# Altium footprint library ICs And Semiconductors THD.PcbLib: 507 footprints (part 11 of 32)
Each footprint in its own frame and in the unit in brackets; x right, y up, seen from the top. Pads: shape width x height; smd on the part's side, far side on the other; paste and mask are expansions set on the pad; w line width, h text height; cw(c..) or ccw(c..) is an arc to the next point about the centre after c.
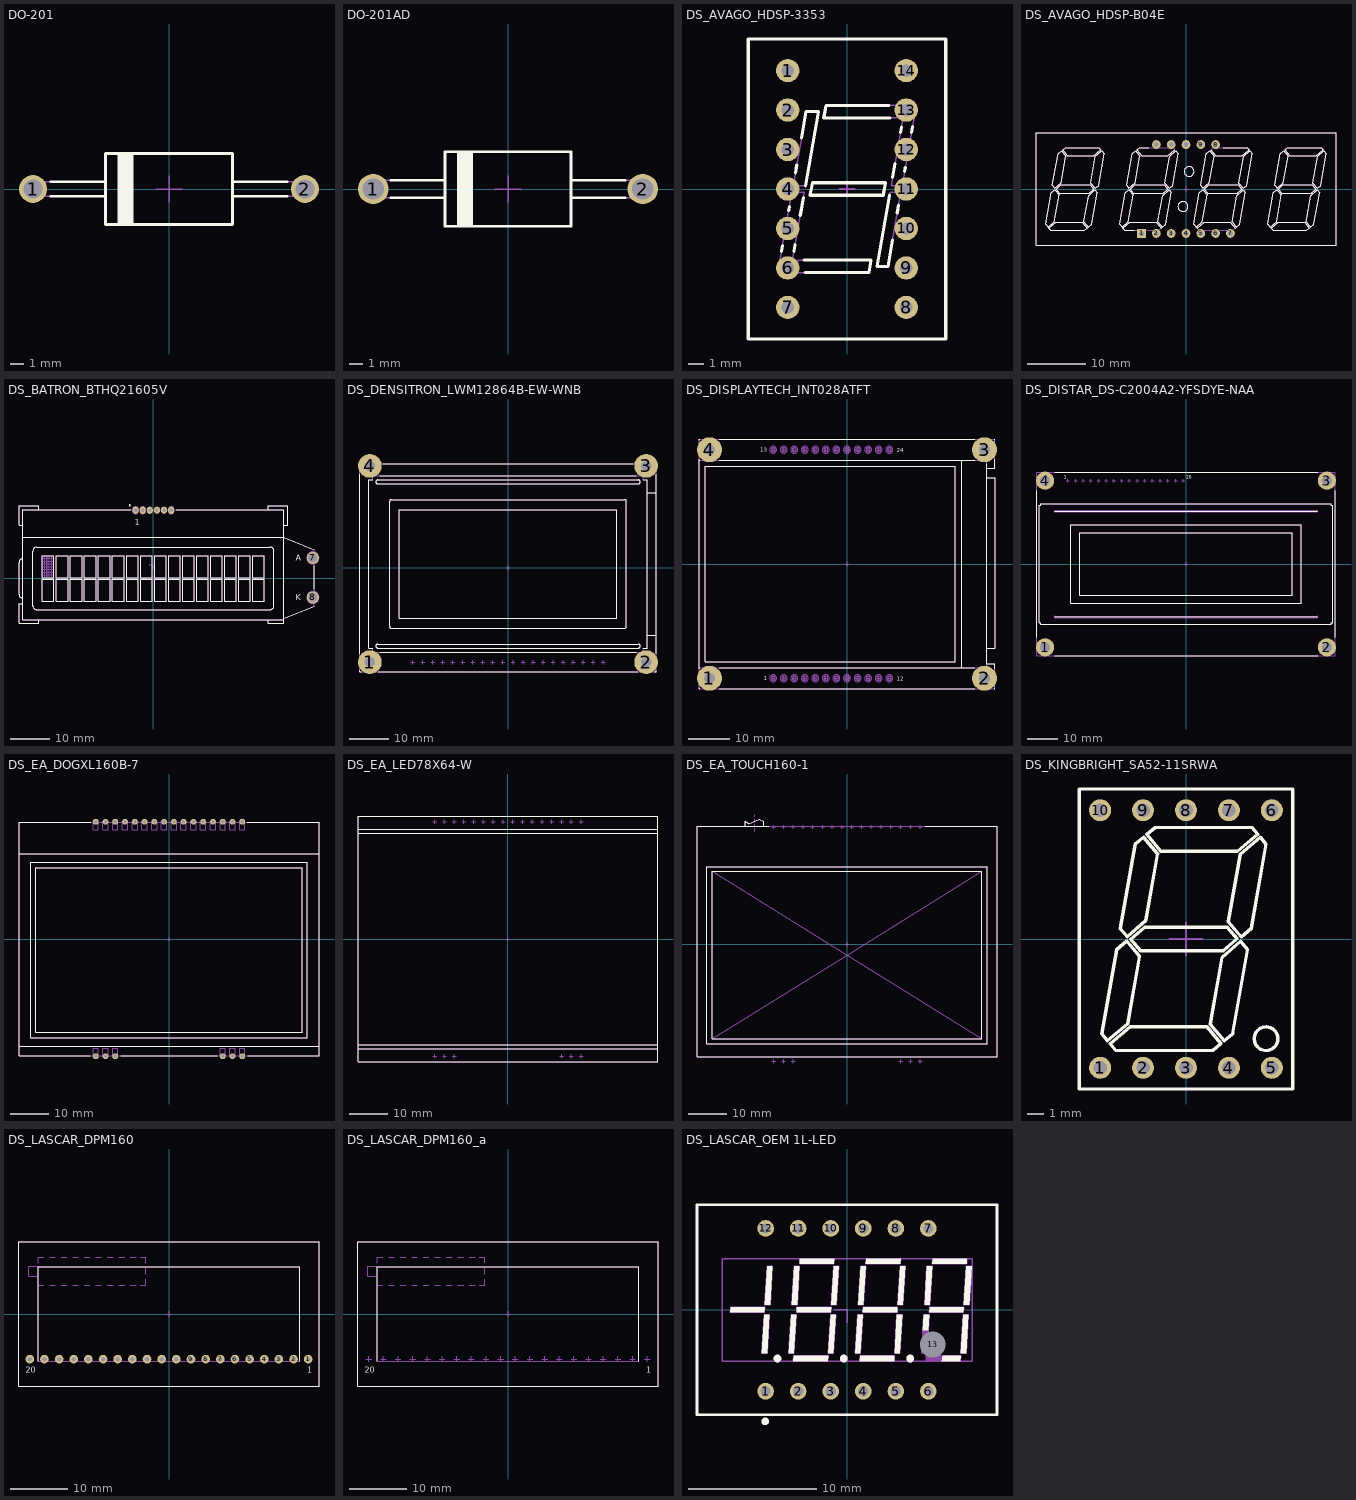
[diagram p10: the footprints below, top view; thin cyan lines are the x and y axes]

## DO-201 [mm] "DO-201, Diode, Axial; Lead Spacing 20.32mm, Lead Dia. 1.07mm, Body Length 9mm, Body Dia. 5.05mm"
height 5.6
pads (2):
  round 2.1 hole 1.4: 1(-10.16,0) 2(10.16,0)
Top Overlay:
  lines w0.2: -8.812,-0.535 -4.75,-0.535 ; -8.812,0.535 -4.75,0.535 ; -3.75,-2.65 -3.75,2.65 ; -3.55,-2.65 -3.55,2.65 ; -3.35,-2.65 -3.35,2.65 ; -3.15,-2.65 -3.15,2.65 ; -2.95,-2.65 -2.95,2.65 ; -2.75,-2.65 -2.75,2.65 ; 4.75,-0.535 8.812,-0.535 ; 4.75,0.535 8.812,0.535 ; -4.75,-2.65 4.75,-2.65 4.75,2.65 -4.75,2.65 -4.75,-2.65
Notvisible:
  lines w0.1: -11.16,0 -10.16,0 ; -10.16,-1 -10.16,0 ; -10.16,1 -10.16,0 ; -9.16,0 -10.16,0 ; -1,0 0,0 ; 0,-1 0,0 ; 0,1 0,0 ; 1,0 0,0 ; 9.16,0 10.16,0 ; 10.16,-1 10.16,0 ; 10.16,1 10.16,0 ; 11.16,0 10.16,0
Mechanical 14:
  lines w0.1: -4.75,-0.535 -10.16,-0.535 cw(c-10.16,0) -10.16,0.535 -4.75,0.535 ; -3.75,-2.65 -3.75,2.65 ; -3.55,-2.65 -3.55,2.65 ; -3.35,-2.65 -3.35,2.65 ; -3.15,-2.65 -3.15,2.65 ; -2.95,-2.65 -2.95,2.65 ; -2.75,-2.65 -2.75,2.65 ; 4.75,-0.535 10.16,-0.535 ccw(c10.16,0) 10.16,0.535 4.75,0.535 ; -4.75,-2.65 4.75,-2.65 4.75,2.65 -4.75,2.65 -4.75,-2.65
3D body "DO-201.stp": height 5.3, standoff -3.8, extent -10.695,-2.65 10.695,2.65

## DO-201AD [mm] "DO-201AD, Diode, Axial; Lead Spacing 20.32mm, Lead Dia. 1.3mm, Body Length 9.5mm, Body Dia. 5.6mm"
height 5.6
pads (2):
  round 2.3 hole 1.6: 1(-10.16,0) 2(10.16,0)
Top Overlay:
  lines w0.2: -8.85,-0.65 -4.75,-0.65 ; -8.85,0.65 -4.75,0.65 ; -3.75,-2.8 -3.75,2.8 ; -3.55,-2.8 -3.55,2.8 ; -3.35,-2.8 -3.35,2.8 ; -3.15,-2.8 -3.15,2.8 ; -2.95,-2.8 -2.95,2.8 ; -2.75,-2.8 -2.75,2.8 ; 4.75,-0.65 8.85,-0.65 ; 4.75,0.65 8.85,0.65 ; -4.75,-2.8 4.75,-2.8 4.75,2.8 -4.75,2.8 -4.75,-2.8
Notvisible:
  lines w0.1: -11.16,0 -10.16,0 ; -10.16,-1 -10.16,0 ; -10.16,1 -10.16,0 ; -9.16,0 -10.16,0 ; -1,0 0,0 ; 0,-1 0,0 ; 0,1 0,0 ; 1,0 0,0 ; 9.16,0 10.16,0 ; 10.16,-1 10.16,0 ; 10.16,1 10.16,0 ; 11.16,0 10.16,0
Mechanical 14:
  lines w0.1: -4.75,-0.65 -10.16,-0.65 cw(c-10.16,0) -10.16,0.65 -4.75,0.65 ; -3.75,-2.8 -3.75,2.8 ; -3.55,-2.8 -3.55,2.8 ; -3.35,-2.8 -3.35,2.8 ; -3.15,-2.8 -3.15,2.8 ; -2.95,-2.8 -2.95,2.8 ; -2.75,-2.8 -2.75,2.8 ; 4.75,-0.65 10.16,-0.65 ccw(c10.16,0) 10.16,0.65 4.75,0.65 ; -4.75,-2.8 4.75,-2.8 4.75,2.8 -4.75,2.8 -4.75,-2.8
3D body "DO-201AD.stp": height 5.6, standoff -3.8, extent -10.81,-2.8 10.81,2.8

## DS_AVAGO_HDSP-3353 [mm] "10.9mm Single Digit, Common Cathode, HER Seven Segment Display, Body 12.7x19.05mm"
height 7.87
pads (14):
  round 1.5 hole 0.8: 1(-3.81,7.62) 2(-3.81,5.08) 3(-3.81,2.54) 4(-3.81,0) 5(-3.81,-2.54) 6(-3.81,-5.08) 7(-3.81,-7.62) 8(3.81,-7.62) 9(3.81,-5.08) 10(3.81,-2.54) 11(3.81,0) 12(3.81,2.54) 13(3.81,5.08) 14(3.81,7.62)
Top Overlay:
  lines w0.2: -4.211,-4.002 -4.147,-3.64 ; -3.75,-1.392 -3.707,-1.145 ; -3.411,-4.002 -3.338,-3.589 ; -3.321,1.041 -3.232,1.546 ; -3.008,-1.716 -2.803,-0.555 ; -2.927,3.277 -2.627,4.977 -1.827,4.977 -2.67,0.2 -2.678,0.2 ; -2.776,-4.577 1.548,-4.577 1.407,-5.377 -2.699,-5.377 ; 2.699,5.377 -1.357,5.377 -1.498,4.577 2.776,4.577 ; 2.734,-0.405 1.927,-4.977 2.627,-4.977 2.927,-3.277 ; 2.937,0.749 3.094,1.64 ; 3.232,-1.546 3.321,-1.041 ; 3.445,3.631 3.505,3.971 ; 3.707,1.145 3.75,1.392 ; 4.147,3.64 4.211,4.002 ; -6.35,-9.65 6.35,-9.65 6.35,9.65 -6.35,9.65 -6.35,-9.65 ; -2.372,-0.4 -2.231,0.4 2.472,0.4 2.331,-0.4 -2.372,-0.4
Notvisible:
  lines w0.1: -4.31,-7.62 -3.81,-7.62 ; -4.31,-5.08 -3.81,-5.08 ; -4.31,-2.54 -3.81,-2.54 ; -4.31,0 -3.81,0 ; -4.31,2.54 -3.81,2.54 ; -4.31,5.08 -3.81,5.08 ; -4.31,7.62 -3.81,7.62 ; -3.81,-8.12 -3.81,-7.62 ; -3.81,-7.12 -3.81,-7.62 ; -3.81,-5.58 -3.81,-5.08 ; -3.81,-4.58 -3.81,-5.08 ; -3.81,-3.04 -3.81,-2.54 ; -3.81,-2.04 -3.81,-2.54 ; -3.81,-0.5 -3.81,0 ; -3.81,0.5 -3.81,0 ; -3.81,2.04 -3.81,2.54 ; -3.81,3.04 -3.81,2.54 ; -3.81,4.58 -3.81,5.08 ; -3.81,5.58 -3.81,5.08 ; -3.81,7.12 -3.81,7.62 ; -3.81,8.12 -3.81,7.62 ; -3.31,-7.62 -3.81,-7.62 ; -3.31,-5.08 -3.81,-5.08 ; -3.31,-2.54 -3.81,-2.54 ; -3.31,0 -3.81,0 ; -3.31,2.54 -3.81,2.54 ; -3.31,5.08 -3.81,5.08 ; -3.31,7.62 -3.81,7.62 ; -0.5,0 0,0 ; 0,-0.5 0,0 ; 0,0.5 0,0 ; 0.5,0 0,0 ; 3.31,-7.62 3.81,-7.62 ; 3.31,-5.08 3.81,-5.08 ; 3.31,-2.54 3.81,-2.54 ; 3.31,0 3.81,0 ; 3.31,2.54 3.81,2.54 ; 3.31,5.08 3.81,5.08 ; 3.31,7.62 3.81,7.62 ; 3.81,-8.12 3.81,-7.62 ; 3.81,-7.12 3.81,-7.62 ; 3.81,-5.58 3.81,-5.08 ; 3.81,-4.58 3.81,-5.08 ; 3.81,-3.04 3.81,-2.54 ; 3.81,-2.04 3.81,-2.54 ; 3.81,-0.5 3.81,0 ; 3.81,0.5 3.81,0 ; 3.81,2.04 3.81,2.54 ; 3.81,3.04 3.81,2.54 ; 3.81,4.58 3.81,5.08 ; 3.81,5.58 3.81,5.08 ; 3.81,7.12 3.81,7.62 ; 3.81,8.12 3.81,7.62 ; 4.31,-7.62 3.81,-7.62 ; 4.31,-5.08 3.81,-5.08 ; 4.31,-2.54 3.81,-2.54 ; 4.31,0 3.81,0 ; 4.31,2.54 3.81,2.54 ; 4.31,5.08 3.81,5.08 ; 4.31,7.62 3.81,7.62
Mechanical 14:
  lines w0.1: -6.35,-9.65 6.35,-9.65 6.35,9.65 -6.35,9.65 -6.35,-9.65 ; -4.383,-4.977 -3.583,-4.977 -2.74,-0.2 -3.54,-0.2 -4.383,-4.977 ; -3.47,0.2 -2.627,4.977 -1.827,4.977 -2.67,0.2 -3.47,0.2 ; -3.303,-5.377 1.407,-5.377 1.548,-4.577 -3.162,-4.577 -3.303,-5.377 ; -2.372,-0.4 -2.231,0.4 2.472,0.4 2.331,-0.4 -2.372,-0.4 ; -1.498,4.577 3.212,4.577 3.353,5.377 -1.357,5.377 -1.498,4.577 ; 1.927,-4.977 2.77,-0.2 3.47,-0.2 2.627,-4.977 1.927,-4.977 ; 2.84,0.2 3.683,4.977 4.383,4.977 3.54,0.2 2.84,0.2
3D body "DS_AVAGO_HDSP-3353.stp": height 7.87, standoff -3.6, extent -6.35,-9.65 6.35,9.65

## DS_AVAGO_HDSP-B04E [mm] "Four Digit 0.56\" GaP HER Seven Segment Display"
height 8.25
pads (12):
  rect 1.5x1.5 hole 0.8: 1(-7.62,-7.62)
  round 1.5 hole 0.8: 2(-5.08,-7.62) 3(-2.54,-7.62) 4(0,-7.62) 5(2.54,-7.62) 6(5.08,-7.62) 7(7.62,-7.62) 8(5.08,7.62) 9(2.54,7.62) 10(0,7.62) 11(-2.54,7.62) 12(-5.08,7.62)
Top Overlay:
  drawing of 168 lines, arcs and shapes, not listed
Notvisible:
  lines w0.1: -8.12,-7.62 -7.62,-7.62 ; -7.62,-8.12 -7.62,-7.62 ; -7.62,-7.12 -7.62,-7.62 ; -7.12,-7.62 -7.62,-7.62 ; -5.58,-7.62 -5.08,-7.62 ; -5.58,7.62 -5.08,7.62 ; -5.08,-8.12 -5.08,-7.62 ; -5.08,-7.12 -5.08,-7.62 ; -5.08,7.12 -5.08,7.62 ; -5.08,8.12 -5.08,7.62 ; -4.58,-7.62 -5.08,-7.62 ; -4.58,7.62 -5.08,7.62 ; -3.04,-7.62 -2.54,-7.62 ; -3.04,7.62 -2.54,7.62 ; -2.54,-8.12 -2.54,-7.62 ; -2.54,-7.12 -2.54,-7.62 ; -2.54,7.12 -2.54,7.62 ; -2.54,8.12 -2.54,7.62 ; -2.04,-7.62 -2.54,-7.62 ; -2.04,7.62 -2.54,7.62 ; -0.5,-7.62 0,-7.62 ; -0.5,0 0,0 ; -0.5,7.62 0,7.62 ; 0,-8.12 0,-7.62 ; 0,-7.12 0,-7.62 ; 0,-0.5 0,0 ; 0,0.5 0,0 ; 0,7.12 0,7.62 ; 0,8.12 0,7.62 ; 0.5,-7.62 0,-7.62 ; 0.5,0 0,0 ; 0.5,7.62 0,7.62 ; 2.04,-7.62 2.54,-7.62 ; 2.04,7.62 2.54,7.62 ; 2.54,-8.12 2.54,-7.62 ; 2.54,-7.12 2.54,-7.62 ; 2.54,7.12 2.54,7.62 ; 2.54,8.12 2.54,7.62 ; 3.04,-7.62 2.54,-7.62 ; 3.04,7.62 2.54,7.62 ; 4.58,-7.62 5.08,-7.62 ; 4.58,7.62 5.08,7.62 ; 5.08,-8.12 5.08,-7.62 ; 5.08,-7.12 5.08,-7.62 ; 5.08,7.12 5.08,7.62 ; 5.08,8.12 5.08,7.62 ; 5.58,-7.62 5.08,-7.62 ; 5.58,7.62 5.08,7.62 ; 7.12,-7.62 7.62,-7.62 ; 7.62,-8.12 7.62,-7.62 ; 7.62,-7.12 7.62,-7.62 ; 8.12,-7.62 7.62,-7.62
Mechanical 14:
  drawing of 174 lines, arcs and shapes, not listed
3D body "DS_AVAGO_HDSP-B04E.stp": height 8.25, standoff -3.1, extent -25.725,-9.675 25.725,9.675

## DS_BATRON_BTHQ21605V [mm] "LCD Display Module, 16 Characters (5x8 Dots) x 2 Lines, I2C-bus Data Interface, With White Backlight, Body 74.5x29.8mm"
height 4.5
pads (8):
  rrect100% 1.5x1.8 hole 0.9: 1(-4.5,17.25) 2(-2.7,17.25) 3(-0.9,17.25) 4(0.9,17.25) 5(2.7,17.25) 6(4.5,17.25)
  round 3.1 hole 2.4: 7(40.35,5.2) 8(40.35,-4.8)
Top Overlay:
  drawing of 163 lines, arcs and shapes, not listed
  text "1" at -4.658,13.465 h1.5
  text "A" at 36,4.45 h1.5
  text "K" at 36,-5.55 h1.5
Notvisible:
  drawing of 220 lines, arcs and shapes, not listed
Mechanical 14:
  drawing of 185 lines, arcs and shapes, not listed
  text "1" at -4.658,13.465 h1.5
  text "A" at 36,4.45 h1.5
  text "K" at 36,-5.55 h1.5
3D body "DS_BATRON_BTHQ21605V.stp": height 4.5, standoff -4.95, extent -34,-11.4 40.65,18.4

## DS_DENSITRON_LWM12864B-EW-WNB [mm] "LCD Display Module, 128x64 Dots,Transmissive Negative, BL White LED, Wide Temp, Negative Voltage Generator, STN Blue"
height 8.9
pads (4):
  round 6 hole 2.6: 1(-35,-23.85) 2(35,-23.85) 3(35,25.85) 4(-35,25.85)
Top Overlay:
  lines w0.2: -37.5,-25.927 -37.5,-26.35 -37.077,-26.35 ; -37.5,-21.773 -37.5,23.773 ; -34.3,-20.3 -35.3,-20.3 -35.3,22.3 -34.3,22.3 ; -32.923,-26.35 32.923,-26.35 ; -32.5,-21.3 32.5,-21.3 ; -32.5,23.3 32.5,23.3 ; -31.789,26.35 31.789,26.35 ; 34.3,-20.3 35.3,-20.3 35.3,22.3 34.3,22.3 ; 35.3,-17 37.5,-17 ; 35.3,19 37.5,19 ; 37.077,-26.35 37.5,-26.35 37.5,-25.927 ; 37.5,-21.773 37.5,23.773 ; -33,-20.3 cw(c-33,-19.8) -33,-19.3 33,-19.3 cw(c33,-19.8) 33,-20.3 -33,-20.3 ; -33,21.3 cw(c-33,21.8) -33,22.3 33,22.3 cw(c33,21.8) 33,21.3 -33,21.3 ; -30,-14.8 ccw(c-29.5,-14.8) -29.5,-15.3 29.5,-15.3 ccw(c29.5,-14.8) 30,-14.8 30,16.8 ccw(c29.5,16.8) 29.5,17.3 -29.5,17.3 ccw(c-29.5,16.8) -30,16.8 -30,-14.8 ; -27.5,-12.74 -27.5,14.74 27.5,14.74 27.5,-12.74 -27.5,-12.74
Notvisible:
  lines w0.1: -35.5,-23.85 -35,-23.85 ; -35.5,25.85 -35,25.85 ; -35,-24.35 -35,-23.85 ; -35,-23.35 -35,-23.85 ; -35,25.35 -35,25.85 ; -35,26.35 -35,25.85 ; -34.5,-23.85 -35,-23.85 ; -34.5,25.85 -35,25.85 ; -24.63,-23.85 -24.13,-23.85 ; -24.13,-24.35 -24.13,-23.85 ; -24.13,-23.35 -24.13,-23.85 ; -23.63,-23.85 -24.13,-23.85 ; -22.09,-23.85 -21.59,-23.85 ; -21.59,-24.35 -21.59,-23.85 ; -21.59,-23.35 -21.59,-23.85 ; -21.09,-23.85 -21.59,-23.85 ; -19.55,-23.85 -19.05,-23.85 ; -19.05,-24.35 -19.05,-23.85 ; -19.05,-23.35 -19.05,-23.85 ; -18.55,-23.85 -19.05,-23.85 ; -17.01,-23.85 -16.51,-23.85 ; -16.51,-24.35 -16.51,-23.85 ; -16.51,-23.35 -16.51,-23.85 ; -16.01,-23.85 -16.51,-23.85 ; -14.47,-23.85 -13.97,-23.85 ; -13.97,-24.35 -13.97,-23.85 ; -13.97,-23.35 -13.97,-23.85 ; -13.47,-23.85 -13.97,-23.85 ; -11.93,-23.85 -11.43,-23.85 ; -11.43,-24.35 -11.43,-23.85 ; -11.43,-23.35 -11.43,-23.85 ; -10.93,-23.85 -11.43,-23.85 ; -9.39,-23.85 -8.89,-23.85 ; -8.89,-24.35 -8.89,-23.85 ; -8.89,-23.35 -8.89,-23.85 ; -8.39,-23.85 -8.89,-23.85 ; -6.85,-23.85 -6.35,-23.85 ; -6.35,-24.35 -6.35,-23.85 ; -6.35,-23.35 -6.35,-23.85 ; -5.85,-23.85 -6.35,-23.85 ; -4.31,-23.85 -3.81,-23.85 ; -3.81,-24.35 -3.81,-23.85 ; -3.81,-23.35 -3.81,-23.85 ; -3.31,-23.85 -3.81,-23.85 ; -1.77,-23.85 -1.27,-23.85 ; -1.27,-24.35 -1.27,-23.85 ; -1.27,-23.35 -1.27,-23.85 ; -0.77,-23.85 -1.27,-23.85 ; -0.5,0 0,0 ; 0,-0.5 0,0 ; 0,0.5 0,0 ; 0.5,0 0,0 ; 0.77,-23.85 1.27,-23.85 ; 1.27,-24.35 1.27,-23.85 ; 1.27,-23.35 1.27,-23.85 ; 1.77,-23.85 1.27,-23.85 ; 3.31,-23.85 3.81,-23.85 ; 3.81,-24.35 3.81,-23.85 ; 3.81,-23.35 3.81,-23.85 ; 4.31,-23.85 3.81,-23.85 ; 5.85,-23.85 6.35,-23.85 ; 6.35,-24.35 6.35,-23.85 ; 6.35,-23.35 6.35,-23.85 ; 6.85,-23.85 6.35,-23.85 ; 8.39,-23.85 8.89,-23.85 ; 8.89,-24.35 8.89,-23.85 ; 8.89,-23.35 8.89,-23.85 ; 9.39,-23.85 8.89,-23.85 ; 10.93,-23.85 11.43,-23.85 ; 11.43,-24.35 11.43,-23.85 ; 11.43,-23.35 11.43,-23.85 ; 11.93,-23.85 11.43,-23.85 ; 13.47,-23.85 13.97,-23.85 ; 13.97,-24.35 13.97,-23.85 ; 13.97,-23.35 13.97,-23.85 ; 14.47,-23.85 13.97,-23.85 ; 16.01,-23.85 16.51,-23.85 ; 16.51,-24.35 16.51,-23.85 ; 16.51,-23.35 16.51,-23.85 ; 17.01,-23.85 16.51,-23.85 ; 18.55,-23.85 19.05,-23.85 ; 19.05,-24.35 19.05,-23.85 ; 19.05,-23.35 19.05,-23.85 ; 19.55,-23.85 19.05,-23.85 ; 21.09,-23.85 21.59,-23.85 ; 21.59,-24.35 21.59,-23.85 ; 21.59,-23.35 21.59,-23.85 ; 22.09,-23.85 21.59,-23.85 ; 23.63,-23.85 24.13,-23.85 ; 24.13,-24.35 24.13,-23.85 ; 24.13,-23.35 24.13,-23.85 ; 24.63,-23.85 24.13,-23.85 ; 34.5,-23.85 35,-23.85 ; 34.5,25.85 35,25.85 ; 35,-24.35 35,-23.85 ; 35,-23.35 35,-23.85 ; 35,25.35 35,25.85 ; 35,26.35 35,25.85 ; 35.5,-23.85 35,-23.85 ; 35.5,25.85 35,25.85
Mechanical 14:
  circle w0.1: c-35,-23.85 r1.25
  circle w0.1: c35,-23.85 r1.25
  lines w0.1: 35.3,-17 37.5,-17 ; 35.3,19 37.5,19 ; -37.5,-26.35 37.5,-26.35 37.5,26.35 35.866,26.35 cw(c35,25.85) 34.134,26.35 -34.134,26.35 cw(c-35,25.85) -35.866,26.35 -37.5,26.35 -37.5,-26.35 ; -35.3,-20.3 -35.3,22.3 -34.3,22.3 -34.3,23.3 34.3,23.3 34.3,22.3 35.3,22.3 35.3,-20.3 34.3,-20.3 34.3,-21.3 -34.3,-21.3 -34.3,-20.3 -35.3,-20.3 ; -33,-20.3 cw(c-33,-19.8) -33,-19.3 33,-19.3 cw(c33,-19.8) 33,-20.3 -33,-20.3 ; -33,21.3 cw(c-33,21.8) -33,22.3 33,22.3 cw(c33,21.8) 33,21.3 -33,21.3 ; -30,-14.8 ccw(c-29.5,-14.8) -29.5,-15.3 29.5,-15.3 ccw(c29.5,-14.8) 30,-14.8 30,16.8 ccw(c29.5,16.8) 29.5,17.3 -29.5,17.3 ccw(c-29.5,16.8) -30,16.8 -30,-14.8 ; -27.5,-12.74 -27.5,14.74 27.5,14.74 27.5,-12.74 -27.5,-12.74
3D body "DS_DENSITRON_LWM12864B-EW-WNB.stp": height 8.9, standoff 0, extent -37.5,-26.35 37.5,26.35

## DS_DISPLAYTECH_INT028ATFT [mm] "2.8\" Integrated TFT Display Module (250RGB x 320 Dots), Body 71.2 x60mm"
height 6.55
pads (4):
  round 6 hole 2.6: 1(-33.1,-27.5) 2(33.1,-27.5) 3(33.1,27.5) 4(-33.1,27.5)
Top Overlay:
  lines w0.2: -35.6,-29.804 -35.6,-30 -35.404,-30 ; -35.6,-25.196 -35.6,25.196 ; -35.6,29.804 -35.6,30 -35.404,30 ; -30.796,-30 30.796,-30 ; -30.796,30 30.796,30 ; 27.6,25 27.6,-25 ; 33.6,-24 35.6,-24 35.6,-25.196 ; 33.6,23 35.6,23 35.6,25.196 ; 35.404,-30 35.6,-30 35.6,-29.804 ; 35.404,30 35.6,30 35.6,29.804 ; -35.6,-25 -35.6,25 ; -35.6,-25 -35.404,-25 -35.6,-25 ; -35.6,25 -35.404,25 -35.6,25 ; -34.1,-23.5 -34.1,23.5 ; -34.1,-23.5 26.1,-23.5 ; -34.1,-23.5 -34.1,23.5 ; -34.1,-23.5 26.1,-23.5 ; -34.1,23.5 26.1,23.5 ; -34.1,23.5 26.1,23.5 ; 26.1,-23.5 26.1,23.5 ; 26.1,-23.5 26.1,23.5 ; 27.6,-25 -30.796,-25 30.796,-25 27.6,-25 ; -30.796,25 30.796,25 -30.796,25 ; 33.599,20.75 33.6,24.137 33.6,-24.137 33.6,-20.25 35.6,-20.25 35.529,20.75 33.599,20.75
  text "13" at -20.893,27.06 h1
  text "24" at 11.967,26.935 h1
  text "12" at 11.967,-28.065 h1
  text "1" at -20.088,-27.965 h1
Notvisible:
  lines w0.1: -33.6,-27.5 -33.1,-27.5 ; -33.6,27.5 -33.1,27.5 ; -33.1,-28 -33.1,-27.5 ; -33.1,-27 -33.1,-27.5 ; -33.1,27 -33.1,27.5 ; -33.1,28 -33.1,27.5 ; -32.6,-27.5 -33.1,-27.5 ; -32.6,27.5 -33.1,27.5 ; -18.28,-27.5 -17.78,-27.5 ; -18.28,27.5 -17.78,27.5 ; -17.78,-28 -17.78,-27.5 ; -17.78,-27 -17.78,-27.5 ; -17.78,27 -17.78,27.5 ; -17.78,28 -17.78,27.5 ; -17.28,-27.5 -17.78,-27.5 ; -17.28,27.5 -17.78,27.5 ; -15.74,-27.5 -15.24,-27.5 ; -15.74,27.5 -15.24,27.5 ; -15.24,-28 -15.24,-27.5 ; -15.24,-27 -15.24,-27.5 ; -15.24,27 -15.24,27.5 ; -15.24,28 -15.24,27.5 ; -14.74,-27.5 -15.24,-27.5 ; -14.74,27.5 -15.24,27.5 ; -13.2,-27.5 -12.7,-27.5 ; -13.2,27.5 -12.7,27.5 ; -12.7,-28 -12.7,-27.5 ; -12.7,-27 -12.7,-27.5 ; -12.7,27 -12.7,27.5 ; -12.7,28 -12.7,27.5 ; -12.2,-27.5 -12.7,-27.5 ; -12.2,27.5 -12.7,27.5 ; -10.66,-27.5 -10.16,-27.5 ; -10.66,27.5 -10.16,27.5 ; -10.16,-28 -10.16,-27.5 ; -10.16,-27 -10.16,-27.5 ; -10.16,27 -10.16,27.5 ; -10.16,28 -10.16,27.5 ; -9.66,-27.5 -10.16,-27.5 ; -9.66,27.5 -10.16,27.5 ; -8.12,-27.5 -7.62,-27.5 ; -8.12,27.5 -7.62,27.5 ; -7.62,-28 -7.62,-27.5 ; -7.62,-27 -7.62,-27.5 ; -7.62,27 -7.62,27.5 ; -7.62,28 -7.62,27.5 ; -7.12,-27.5 -7.62,-27.5 ; -7.12,27.5 -7.62,27.5 ; -5.58,-27.5 -5.08,-27.5 ; -5.58,27.5 -5.08,27.5 ; -5.08,-28 -5.08,-27.5 ; -5.08,-27 -5.08,-27.5 ; -5.08,27 -5.08,27.5 ; -5.08,28 -5.08,27.5 ; -4.58,-27.5 -5.08,-27.5 ; -4.58,27.5 -5.08,27.5 ; -3.04,-27.5 -2.54,-27.5 ; -3.04,27.5 -2.54,27.5 ; -2.54,-28 -2.54,-27.5 ; -2.54,-27 -2.54,-27.5 ; -2.54,27 -2.54,27.5 ; -2.54,28 -2.54,27.5 ; -2.04,-27.5 -2.54,-27.5 ; -2.04,27.5 -2.54,27.5 ; -0.5,-27.5 0,-27.5 ; -0.5,0 0,0 ; -0.5,27.5 0,27.5 ; 0,-28 0,-27.5 ; 0,-27 0,-27.5 ; 0,-0.5 0,0 ; 0,0.5 0,0 ; 0,27 0,27.5 ; 0,28 0,27.5 ; 0.5,-27.5 0,-27.5 ; 0.5,0 0,0 ; 0.5,27.5 0,27.5 ; 2.04,-27.5 2.54,-27.5 ; 2.04,27.5 2.54,27.5 ; 2.54,-28 2.54,-27.5 ; 2.54,-27 2.54,-27.5 ; 2.54,27 2.54,27.5 ; 2.54,28 2.54,27.5 ; 3.04,-27.5 2.54,-27.5 ; 3.04,27.5 2.54,27.5 ; 4.58,-27.5 5.08,-27.5 ; 4.58,27.5 5.08,27.5 ; 5.08,-28 5.08,-27.5 ; 5.08,-27 5.08,-27.5 ; 5.08,27 5.08,27.5 ; 5.08,28 5.08,27.5 ; 5.58,-27.5 5.08,-27.5 ; 5.58,27.5 5.08,27.5 ; 7.12,-27.5 7.62,-27.5 ; 7.12,27.5 7.62,27.5 ; 7.62,-28 7.62,-27.5 ; 7.62,-27 7.62,-27.5 ; 7.62,27 7.62,27.5 ; 7.62,28 7.62,27.5 ; 8.12,-27.5 7.62,-27.5 ; 8.12,27.5 7.62,27.5 ; 9.66,-27.5 10.16,-27.5 ; 9.66,27.5 10.16,27.5 ; 10.16,-28 10.16,-27.5 ; 10.16,-27 10.16,-27.5 ; 10.16,27 10.16,27.5 ; 10.16,28 10.16,27.5 ; 10.66,-27.5 10.16,-27.5 ; 10.66,27.5 10.16,27.5 ; 32.6,-27.5 33.1,-27.5 ; 32.6,27.5 33.1,27.5 ; 33.1,-28 33.1,-27.5 ; 33.1,-27 33.1,-27.5 ; 33.1,27 33.1,27.5 ; 33.1,28 33.1,27.5 ; 33.6,-27.5 33.1,-27.5 ; 33.6,27.5 33.1,27.5
Mechanical 14:
  circle w0.1: c-33.1,27.5 r1.25
  circle w0.1: c33.1,27.5 r1.25
  circle w0.1: c33.1,-27.5 r1.25
  circle w0.1: c-33.1,-27.5 r1.25
  circle w0.1: c-17.78,27.5 r0.5
  circle w0.1: c-17.78,27.5 r0.85
  circle w0.1: c-15.24,27.5 r0.5
  circle w0.1: c-15.24,27.5 r0.85
  circle w0.1: c-12.7,27.5 r0.5
  circle w0.1: c-12.7,27.5 r0.85
  circle w0.1: c-10.16,27.5 r0.5
  circle w0.1: c-10.16,27.5 r0.85
  circle w0.1: c-7.62,27.5 r0.5
  circle w0.1: c-7.62,27.5 r0.85
  circle w0.1: c-5.08,27.5 r0.5
  circle w0.1: c-5.08,27.5 r0.85
  circle w0.1: c-2.54,27.5 r0.5
  circle w0.1: c-2.54,27.5 r0.85
  circle w0.1: c0,27.5 r0.5
  circle w0.1: c0,27.5 r0.85
  circle w0.1: c2.54,27.5 r0.5
  circle w0.1: c2.54,27.5 r0.85
  circle w0.1: c5.08,27.5 r0.5
  circle w0.1: c5.08,27.5 r0.85
  circle w0.1: c7.62,27.5 r0.5
  circle w0.1: c7.62,27.5 r0.85
  circle w0.1: c10.16,27.5 r0.5
  circle w0.1: c10.16,27.5 r0.85
  circle w0.1: c-17.78,-27.5 r0.5
  circle w0.1: c-17.78,-27.5 r0.85
  circle w0.1: c-15.24,-27.5 r0.5
  circle w0.1: c-15.24,-27.5 r0.85
  circle w0.1: c-12.7,-27.5 r0.5
  circle w0.1: c-12.7,-27.5 r0.85
  circle w0.1: c-10.16,-27.5 r0.5
  circle w0.1: c-10.16,-27.5 r0.85
  circle w0.1: c-7.62,-27.5 r0.5
  circle w0.1: c-7.62,-27.5 r0.85
  circle w0.1: c-5.08,-27.5 r0.5
  circle w0.1: c-5.08,-27.5 r0.85
  circle w0.1: c-2.54,-27.5 r0.5
  circle w0.1: c-2.54,-27.5 r0.85
  circle w0.1: c0,-27.5 r0.5
  circle w0.1: c0,-27.5 r0.85
  circle w0.1: c2.54,-27.5 r0.5
  circle w0.1: c2.54,-27.5 r0.85
  circle w0.1: c5.08,-27.5 r0.5
  circle w0.1: c5.08,-27.5 r0.85
  circle w0.1: c7.62,-27.5 r0.5
  circle w0.1: c7.62,-27.5 r0.85
  circle w0.1: c10.16,-27.5 r0.5
  circle w0.1: c10.16,-27.5 r0.85
  lines w0.1: 27.6,25 27.6,-25 ; 33.6,-24 35.6,-24 35.6,-30 -35.6,-30 -35.6,30 35.6,30 35.6,23 33.6,23 ; -35.6,-25 27.6,-25 ; -35.6,-25 -35.6,25 ; -35.6,-25 33.6,-25 ; -35.6,25 33.6,25 ; -35.6,25 33.6,25 ; -34.1,-23.5 -34.1,23.5 ; -34.1,-23.5 26.1,-23.5 ; -34.1,-23.5 -34.1,23.5 ; -34.1,-23.5 26.1,-23.5 ; -34.1,23.5 26.1,23.5 ; -34.1,23.5 26.1,23.5 ; 26.1,-23.5 26.1,23.5 ; 26.1,-23.5 26.1,23.5 ; 27.6,-25 33.6,-25 ; 33.6,-25 33.6,-20.25 35.6,-20.25 35.529,20.75 33.599,20.75 33.6,25 ; 33.6,-25 33.6,25
  text "13" at -20.893,27.06 h1
  text "24" at 11.967,26.935 h1
  text "12" at 11.967,-28.065 h1
  text "1" at -20.088,-27.965 h1
3D body "DS_DISPLAYTECH_INT028ATFT.stp": height 6.55, standoff 0, extent -35.6,-30 35.6,30

## DS_DISTAR_DS-C2004A2-YFSDYE-NAA [mm] "LCD Display Module, 20 Characters (5x8 Dots) x 4 Lines, I2C-bus Data Interface, With White Backlight, Body 98x60mm"
height 14
pads (4):
  round 6 hole 3.4: 1(-46.5,-27.5) 2(46.5,-27.5) 3(46.5,27.5) 4(-46.5,27.5)
Top Overlay:
  lines w0.2: -49.25,-24.25 -49.25,24.25 ; -43.25,-30.25 43.5,-30.25 ; -43.25,-17.425 43.25,-17.425 ; -43.25,17.425 43.25,17.425 ; -43.25,30.25 43.5,30.25 ; 49.25,-24.25 49.25,24.25 ; -48.5,-19.35 -48,-19.35 -48,-19.85 48,-19.85 48,-19.35 48.5,-19.35 48.5,19.35 48,19.35 48,19.85 -48,19.85 -48,19.35 -48.5,19.35 -48.5,-19.35 ; -38,-13 38,-13 38,13 -38,13 -38,-13 ; -35.055,-10.38 35.055,-10.38 35.055,10.38 -35.055,10.38 -35.055,-10.38
  text "16" at -0.161,28.184 h1.16
  text "1" at -40.393,28.184 h1.16
Notvisible:
  lines w0.05: -47,-27.5 -46.5,-27.5 ; -47,27.5 -46.5,27.5 ; -46.5,-28 -46.5,-27.5 ; -46.5,-27 -46.5,-27.5 ; -46.5,27 -46.5,27.5 ; -46.5,28 -46.5,27.5 ; -46,-27.5 -46.5,-27.5 ; -46,27.5 -46.5,27.5 ; -39.5,27.46 -39,27.46 ; -39,26.96 -39,27.46 ; -39,27.96 -39,27.46 ; -38.5,27.46 -39,27.46 ; -36.96,27.46 -36.46,27.46 ; -36.46,26.96 -36.46,27.46 ; -36.46,27.96 -36.46,27.46 ; -35.96,27.46 -36.46,27.46 ; -34.42,27.46 -33.92,27.46 ; -33.92,26.96 -33.92,27.46 ; -33.92,27.96 -33.92,27.46 ; -33.42,27.46 -33.92,27.46 ; -31.88,27.46 -31.38,27.46 ; -31.38,26.96 -31.38,27.46 ; -31.38,27.96 -31.38,27.46 ; -30.88,27.46 -31.38,27.46 ; -29.34,27.46 -28.84,27.46 ; -28.84,26.96 -28.84,27.46 ; -28.84,27.96 -28.84,27.46 ; -28.34,27.46 -28.84,27.46 ; -26.8,27.46 -26.3,27.46 ; -26.3,26.96 -26.3,27.46 ; -26.3,27.96 -26.3,27.46 ; -25.8,27.46 -26.3,27.46 ; -24.26,27.46 -23.76,27.46 ; -23.76,26.96 -23.76,27.46 ; -23.76,27.96 -23.76,27.46 ; -23.26,27.46 -23.76,27.46 ; -21.72,27.46 -21.22,27.46 ; -21.22,26.96 -21.22,27.46 ; -21.22,27.96 -21.22,27.46 ; -20.72,27.46 -21.22,27.46 ; -19.18,27.46 -18.68,27.46 ; -18.68,26.96 -18.68,27.46 ; -18.68,27.96 -18.68,27.46 ; -18.18,27.46 -18.68,27.46 ; -16.64,27.46 -16.14,27.46 ; -16.14,26.96 -16.14,27.46 ; -16.14,27.96 -16.14,27.46 ; -15.64,27.46 -16.14,27.46 ; -14.1,27.46 -13.6,27.46 ; -13.6,26.96 -13.6,27.46 ; -13.6,27.96 -13.6,27.46 ; -13.1,27.46 -13.6,27.46 ; -11.56,27.46 -11.06,27.46 ; -11.06,26.96 -11.06,27.46 ; -11.06,27.96 -11.06,27.46 ; -10.56,27.46 -11.06,27.46 ; -9.02,27.46 -8.52,27.46 ; -8.52,26.96 -8.52,27.46 ; -8.52,27.96 -8.52,27.46 ; -8.02,27.46 -8.52,27.46 ; -6.48,27.46 -5.98,27.46 ; -5.98,26.96 -5.98,27.46 ; -5.98,27.96 -5.98,27.46 ; -5.48,27.46 -5.98,27.46 ; -3.94,27.46 -3.44,27.46 ; -3.44,26.96 -3.44,27.46 ; -3.44,27.96 -3.44,27.46 ; -2.94,27.46 -3.44,27.46 ; -1.4,27.46 -0.9,27.46 ; -0.9,26.96 -0.9,27.46 ; -0.9,27.96 -0.9,27.46 ; -0.4,27.46 -0.9,27.46 ; 46,-27.5 46.5,-27.5 ; 46,27.5 46.5,27.5 ; 46.5,-28 46.5,-27.5 ; 46.5,-27 46.5,-27.5 ; 46.5,27 46.5,27.5 ; 46.5,28 46.5,27.5 ; 47,-27.5 46.5,-27.5 ; 47,27.5 46.5,27.5
  lines w0.1: -0.5,0 0,0 ; 0,-0.5 0,0 ; 0,0.5 0,0 ; 0.5,0 0,0
Mechanical 14:
  circle w0.1: c46.5,27.5 r1.7